# Altium footprint library IC.PcbLib: 220 footprints (part 12 of 14)
Each footprint in its own frame and in the unit in brackets; x right, y up, seen from the top. Pads: shape width x height; smd on the part's side, far side on the other; paste and mask are expansions set on the pad; w line width, h text height; cw(c..) or ccw(c..) is an arc to the next point about the centre after c.
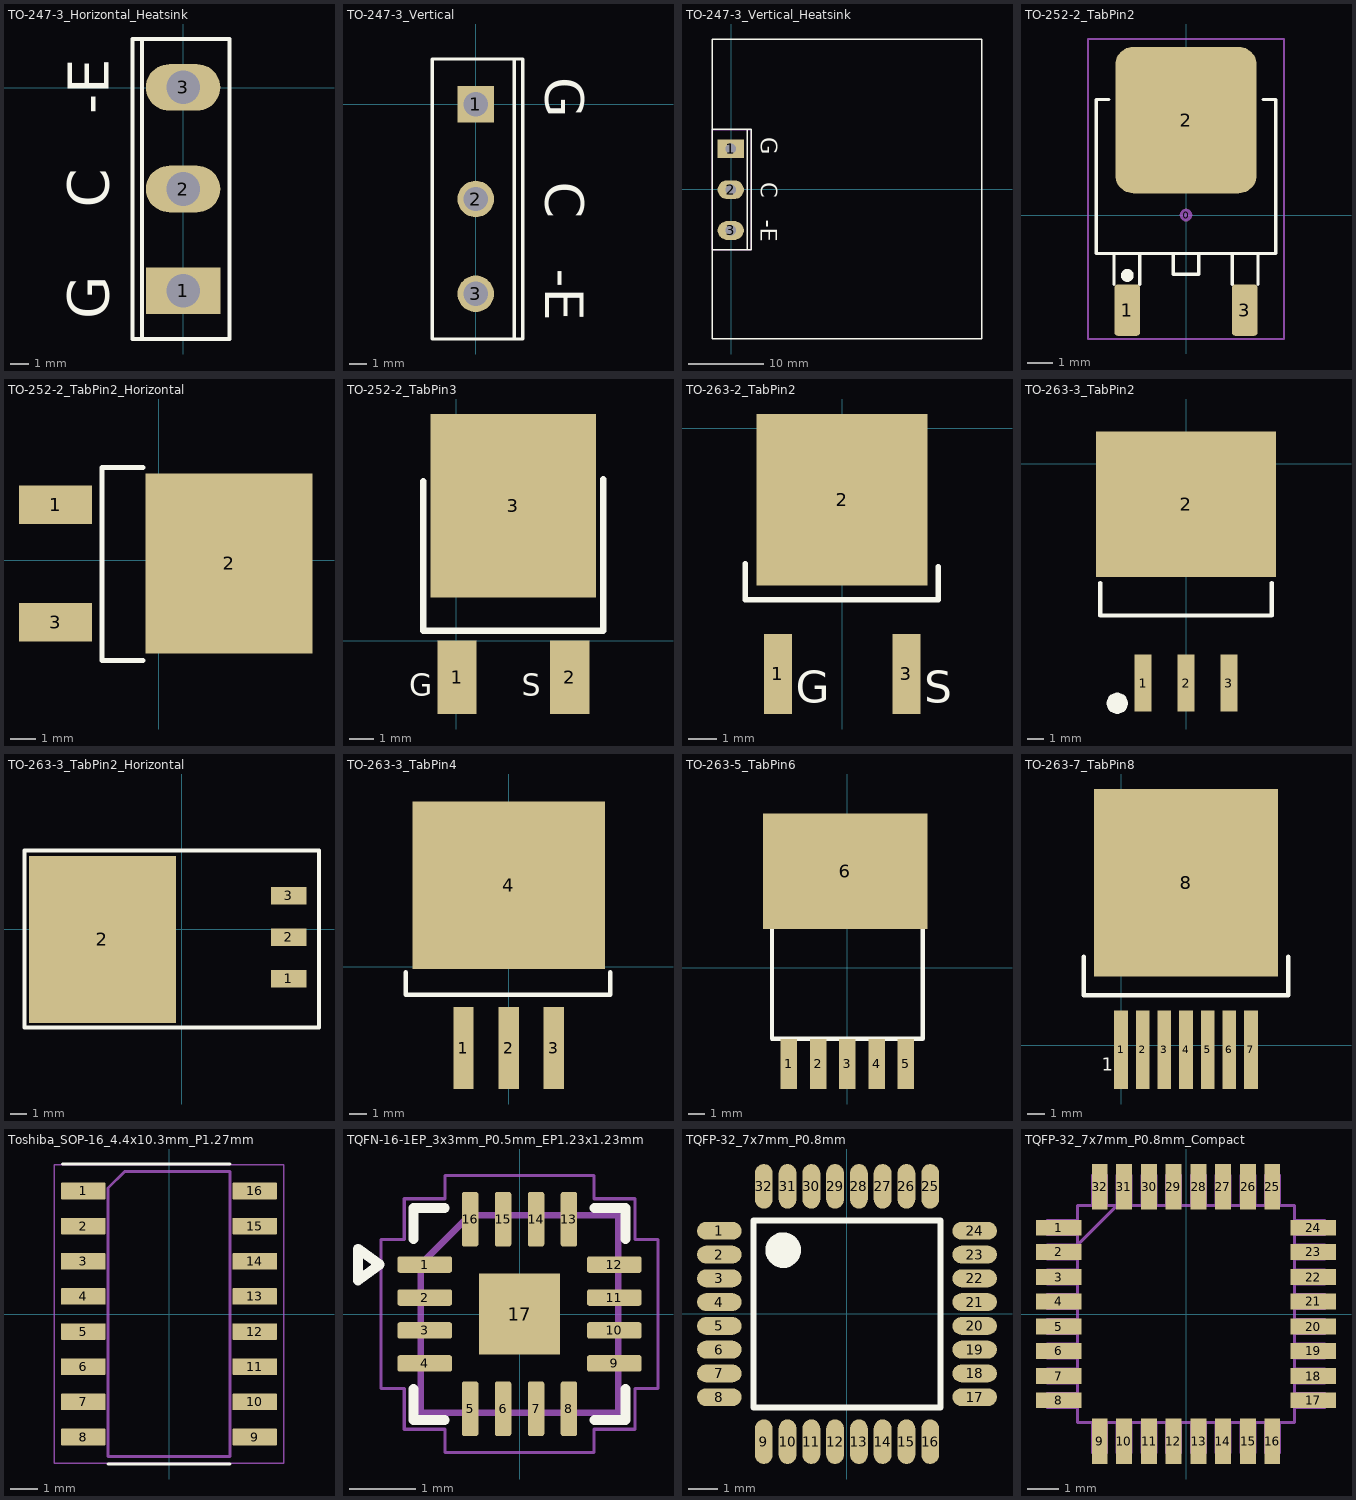
[diagram p11: the footprints below, top view; thin cyan lines are the x and y axes]

## TO-247-3_Horizontal_Heatsink [mm] "TO-247 3-pin bent/horizontal with heatsink, pitch 5.45mm"
height 30
pads (3):
  rect 4x2.5 hole 1.8: 1(0,-10.871)
  oval 4x2.5 hole 1.8: 2(0,-5.421) 3(0,0.029)
Top Overlay:
  lines w0.2: -2.21,-13.471 -2.21,2.629 ; -2.71,-13.471 -2.71,2.629 2.49,2.629 2.49,-13.471 -2.71,-13.471
  text "G" at -4,-12.421 h2.2
  text "C" at -4,-6.421 h2.2
  text "-E" at -4,-1.421 h2.2
3D body "IGBT and Heatsink.STEP": height 18.01, standoff -3.99, extent -7.173,-25.461 32.827,14.539

## TO-247-3_Vertical [mm] "TO-247 3-pin vertical without heatsink, pitch 5.45mm"
pads (3):
  rect 2.1x2.1 hole 1.4: 1(0,0)
  round 2.1 hole 1.4: 2(0,-5.45) 3(0,-10.9)
Top Overlay:
  lines w0.2: 2.21,-13.5 2.21,2.6 ; -2.49,-13.5 2.71,-13.5 2.71,2.6 -2.49,2.6 -2.49,-13.5
  text "-E" at 4,-9.45 h2.2
  text "C" at 4,-4.45 h2.2
  text "G" at 4,1.55 h2.2
3D body "TO-247-3_Vertical.step": height 23.5, standoff -3, extent -7.95,-11.404 7.95,0.504

## TO-247-3_Vertical_Heatsink [mm] "TO-247 3-pin vertical with heatsink, pitch 5.45mm"
pads (3):
  rect 3.5x2.5 hole 1.4: 1(-0.076,5.425)
  oval 3.5x2.5 hole 1.4: 2(-0.076,-0.025) 3(-0.076,-5.475)
Top Overlay:
  lines w0.178: 2.134,-8.075 2.134,8.025 ; 33.426,20.091 -2.566,20.091 -2.566,8.025 ; 33.452,20.091 33.452,-19.964 -2.565,-19.964 -2.565,-8.076 -2.566,-8.075 ; -2.566,-8.075 -2.566,8.025 ; -2.566,-8.075 2.634,-8.075 2.634,8.025 -2.566,8.025
  text "G" at 3.924,6.975 h2.2
  text "C" at 3.924,0.975 h2.2
  text "-E" at 3.924,-4.025 h2.2
Mechanical 13:
  lines w0.1: 2.634,-8.05 2.634,8 ; 2.634,-8.05 -2.566,-8.05 -2.566,8 2.634,8 ; 2.634,-8.05 2.634,8
3D body "tony_assembly_14_asm.stp": height 52, standoff -2.2, extent -2.591,-19.949 33.57,20.051

## TO-252-2_TabPin2 [mm] "TO-252 (DPAK), 2 leads + tab pin 2 (with thermal pad 0)"
pads (4):
  round 0.5 on Mech15: 0(0,0)
  rrect25% 1x2 smd: 1(-2.285,-3.7) 3(2.285,-3.7)
  rrect25% 5.5x5.7 smd: 2(0,3.7)
Top Overlay:
  circle w0.25: c-2.285,-2.35 r0.125
  lines w0.127: -3,4.5 -3.5,4.5 -3.5,-1.5 3.5,-1.5 3.5,4.5 3,4.5 ; -2.8,-2.7 -2.8,-1.5 -1.8,-1.5 -1.8,-2.7 ; 1.8,-2.7 1.8,-1.5 2.8,-1.5 2.8,-2.7 ; -0.5,-2.3 0.5,-2.3 0.5,-1.5 -0.5,-1.5 -0.5,-2.3
Mechanical 15:
  lines w0.076: -3.81,-4.826 3.81,-4.826 3.81,6.858 -3.81,6.858 -3.81,-4.826
3D body "DPAK.stp": height 2.31, standoff 0, extent -3.3,-3.951 3.3,5.762

## TO-252-2_TabPin2_Horizontal [mm] "TO-252 (DPAK) rotated 90deg, 2 leads left + tab pin 2 right"
height 2.39
pads (3):
  rect 2.85x1.5 smd: 1(-4.023,2.163) 3(-4.023,-2.417)
  rect 6.5x7 smd: 2(2.727,-0.127)
Top Overlay:
  lines w0.2: -0.623,-3.9 -2.223,-3.9 -2.223,3.6 -0.623,3.6
3D body "User Library-TO252AA.step": height 2.3, standoff -0.01, extent -4.469,-3.429 5.231,3.151

## TO-252-2_TabPin3 [mm] "TO-252 (DPAK), leads 1-2 bottom + tab pin 3 top"
height 2.4
pads (3):
  rect 1.6x3 smd: 1(0.037,-1.484) 2(4.637,-1.484)
  rect 6.75x7.5 smd: 3(2.337,5.512)
Top Overlay:
  lines w0.254: -1.346,6.516 -1.346,0.416 6,0.416 6,6.6
  text "S" at 2.667,-2.54 h1.52
  text "G" at -1.905,-2.54 h1.52
3D body "CircuitWorks-TO-252.step": height 2.31, standoff 0.01, extent -0.877,-1.282 5.703,8.418

## TO-263-2_TabPin2 [mm] "TO-263-2 (D2PAK), 2 leads bottom + tab pin 2 top, pitch 4.58mm"
height 4.6
pads (3):
  rect 1x2.85 smd: 1(-2.29,-8.75) 3(2.29,-8.75)
  rect 6.096x6.1 smd: 2(0,-2.54)
Top Overlay:
  lines w0.2: -3.454,-4.826 -3.454,-6.1 3.429,-6.1 3.429,-4.928
  text "G" at -1.651,-9.779 h1.14
  text "S" at 2.921,-9.779 h1.14
3D body "User Library-TO252AA.step": height 2.3, standoff -0.01, extent -3.302,-9.295 3.278,0.405

## TO-263-3_TabPin2 [mm] "TO-263-3 (D2PAK), 3 leads bottom + tab pin 2 top, pitch 2.54mm"
pads (5):
  rect 1x3.4 smd: 1(-2.54,-13) 2(0,-13) 3(2.54,-13)
  rect 10.7x8.6 smd: 2(0,-2.4)
  round 1.27 on Top Overlay: ""(-4.075,-14.2)
Top Overlay:
  lines w0.254: -5.08,-7.067 -5.08,-9 5.08,-9 5.08,-7.067
3D body "User Library-TO263-3-1.STEP": height 4.6, standoff -0.03, extent -5.193,-13.894 5.207,1.956

## TO-263-3_TabPin2_Horizontal [mm] "TO-263-3 (D2PAK) rotated 90deg, 3 leads right + tab pin 2 left (LM1085)"
height 1.27
pads (4):
  rect 2.16x1.07 smd: 1(6.545,-3.039) 2(6.545,-0.499) 3(6.545,2.041)
  rect 9x10.2 smd: 2(-4.836,-0.62)
Top Overlay:
  lines w0.254: -9.6,-6 -9.6,4.8 8.4,4.8 8.4,-6 -9.6,-6
3D body "DDPAK-TO-263-3.step": height 4.44, standoff 0, extent -8.98,-5.555 7.67,4.605

## TO-263-3_TabPin4 [mm] "TO-263-3 (D2PAK), 3 leads bottom + tab pin 4 top, pitch 2.54mm"
height 4.57
pads (4):
  rect 1.15x4.6 smd: 1(-2.54,-4.575) 2(0,-4.575) 3(2.54,-4.575)
  rect 10.8x9.4 smd: 4(0,4.575)
Top Overlay:
  lines w0.254: -5.79,-0.325 -5.79,-1.575 5.71,-1.575 5.71,-0.325
3D body "69246.stp": height 4.51, standoff 0.01, extent -5.05,-6.469 5.05,8.921

## TO-263-5_TabPin6 [mil] "TO-263-5 (D2PAK-5), 5 leads + tab, pitch 1.78mm"
pads (6):
  rect 39.37x120 smd: 1(-140,-230) 2(-70,-230) 3(0,-230) 4(70,-230) 5(140,-230)
  rect 393.7x275.59 smd: 6(-5,230)
Top Overlay:
  lines w10: -160,170 -160,240 -140,260 140,260 160,240 160,170 ; -180,-170 180,-170 180,170 -180,170 -180,-170
3D body "TO-263-5.STEP": height 180.12, standoff 0.6, extent -200,-241.79 200,309.98

## TO-263-7_TabPin8 [mm] "TO-263-7 (D2PAK-7), 7 leads + tab, pitch 1.27mm"
height 4.7
pads (8):
  rect 0.8x4.6 smd: 1(0,-0.254) 2(1.27,-0.254) 3(2.54,-0.254) 4(3.81,-0.254) 5(5.08,-0.254) 6(6.35,-0.254) 7(7.62,-0.254)
  rect 10.8x11 smd: 8(3.81,9.531)
Top Overlay:
  lines w0.254: -2.19,5.2 -2.19,2.95 9.81,2.95 9.81,5.2
  text "1" at -1.143,-1.491 h0.76
3D body "User Library-TO263-7-1.STEP": height 4.81, standoff 0.01, extent -1.241,-1.781 8.759,13.889

## Toshiba_SOP-16_4.4x10.3mm_P1.27mm [mm] "TLP281-4, Four-channel phototransistor optocoupler — Opto cách ly quang bốn kênh ngõ ra transistor [Opto cach ly quang bon kenh ngo ra transistor]"
height 2.1
pads (16):
  rrect8% 1.6x0.6 smd: 1(-3.1,4.445) 2(-3.1,3.175) 3(-3.1,1.905) 4(-3.1,0.635) 5(-3.1,-0.635) 6(-3.1,-1.905) 7(-3.1,-3.175) 8(-3.1,-4.445) 9(3.1,-4.445) 10(3.1,-3.175) 11(3.1,-1.905) 12(3.1,-0.635) 13(3.1,0.635) 14(3.1,1.905) 15(3.1,3.175) 16(3.1,4.445)
Top Overlay:
  lines w0.12: -3.85,5.42 2.2,5.42 ; -2.2,-5.42 2.2,-5.42
  text ".Designator" at -2.2,5.6 h1
Mechanical 2:
  lines w0.1: -2.2,-5.15 2.2,-5.15 2.2,5.15 -1.6,5.15 -2.2,4.55 -2.2,-5.15
Mechanical 4:
  lines w0.05: -4.15,-5.4 4.15,-5.4 4.15,5.4 -4.15,5.4 -4.15,-5.4
3D body "Toshiba_SOP-16_4.4x10.3mm_P1.27mm.step": height 0, standoff 0, extent -3.9,-4.745 3.9,4.745

## TQFN-16-1EP_3x3mm_P0.5mm_EP1.23x1.23mm [mm] "MAX98357AETE+T, 3.2 W class-D mono I2S speaker amplifier — IC khuếch đại loa I2S mono Class D 3,2 W [IC khuech dai loa I2S mono Class D 3,2 W]"
height 0.75
pads (17):
  rrect25% 0.825x0.25 smd: 1(-1.438,0.75) 2(-1.438,0.25) 3(-1.438,-0.25) 4(-1.438,-0.75) 9(1.438,-0.75) 10(1.438,-0.25) 11(1.438,0.25) 12(1.438,0.75)
  rrect25% 0.25x0.825 smd: 5(-0.75,-1.438) 6(-0.25,-1.438) 7(0.25,-1.438) 8(0.75,-1.438) 13(0.75,1.438) 14(0.25,1.438) 15(-0.25,1.438) 16(-0.75,1.438)
  rect 1.23x1.23 smd paste-1.23: 17(0,0)
Top Overlay:
  lines w0.15: -1.61,-1.135 -1.61,-1.61 -1.135,-1.61 ; -1.61,1.135 -1.61,1.61 -1.135,1.61 ; 1.135,-1.61 1.61,-1.61 1.61,-1.135 ; 1.135,1.61 1.61,1.61 1.61,1.135 ; -2.45,0.51 -2.12,0.75 -2.45,0.99 -2.45,0.51
Top Paste:
  region: -0.56,0.06 -0.06,0.06 -0.06,0.56 -0.56,0.56
  region: -0.56,-0.56 -0.06,-0.56 -0.06,-0.06 -0.56,-0.06
  region: 0.06,0.06 0.56,0.06 0.56,0.56 0.06,0.56
  region: 0.06,-0.56 0.56,-0.56 0.56,-0.06 0.06,-0.06
Mechanical 2:
  lines w0.1: -1.5,-1.5 1.5,-1.5 1.5,1.5 -0.75,1.5 -1.5,0.75 -1.5,-1.5
Mechanical 4:
  lines w0.05: -2.1,-1.13 -2.1,1.13 -1.75,1.13 -1.75,1.75 -1.13,1.75 -1.13,2.1 1.13,2.1 1.13,1.75 1.75,1.75 1.75,1.13 2.1,1.13 2.1,-1.13 1.75,-1.13 1.75,-1.75 1.13,-1.75 1.13,-2.1 -1.13,-2.1 -1.13,-1.75 -1.75,-1.75 -1.75,-1.13 -2.1,-1.13
3D body "TQFN-16-1EP_3x3mm_P0.5mm_EP1.23x1.23mm.step": height 0, standoff 0, extent -1.85,-1.85 1.85,1.85

## TQFP-32_7x7mm_P0.8mm [mm] "TQFP-32, body 7x7mm, pitch 0.8mm, span 8.6mm"
height 1.2
pads (32):
  oval 1.5x0.6 smd mask+0.076: 1(-4.3,2.8) 2(-4.3,2) 3(-4.3,1.2) 4(-4.3,0.4) 5(-4.3,-0.4) 6(-4.3,-1.2) 7(-4.3,-2) 8(-4.3,-2.8) 17(4.3,-2.8) 18(4.3,-2) 19(4.3,-1.2) 20(4.3,-0.4) 21(4.3,0.4) 22(4.3,1.2) 23(4.3,2) 24(4.3,2.8)
  oval 0.6x1.5 smd mask+0.076: 9(-2.8,-4.3) 10(-2,-4.3) 11(-1.2,-4.3) 12(-0.4,-4.3) 13(0.4,-4.3) 14(1.2,-4.3) 15(2,-4.3) 16(2.8,-4.3) 25(2.8,4.3) 26(2,4.3) 27(1.2,4.3) 28(0.4,4.3) 29(-0.4,4.3) 30(-1.2,4.3) 31(-2,4.3) 32(-2.8,4.3)
Top Overlay:
  circle w0.6: c-2.15,2.15 r0.3
  lines w0.2: -3.15,-3.15 3.15,-3.15 3.15,3.15 -3.15,3.15 -3.15,-3.15
3D body "TQFP80P925X925X120-32N.step": height 1.2, standoff 0, extent -4.625,-4.625 4.625,4.625

## TQFP-32_7x7mm_P0.8mm_Compact [mil] "TQFP-32, body 7x7mm, pitch 0.8mm, span 8.23mm (ATmega168/328)"
pads (32):
  rect 58x20 smd: 1(-162,110) 2(-162,79) 3(-162,47) 4(-162,16) 5(-162,-16) 6(-162,-47) 7(-162,-79) 8(-162,-110) 17(162,-110) 18(162,-79) 19(162,-47) 20(162,-16) 21(162,16) 22(162,47) 23(162,79) 24(162,110)
  rect 20x58 smd: 9(-110,-162) 10(-79,-162) 11(-47,-162) 12(-16,-162) 13(16,-162) 14(47,-162) 15(79,-162) 16(110,-162) 25(110,162) 26(79,162) 27(47,162) 28(16,162) 29(-16,162) 30(-47,162) 31(-79,162) 32(-110,162)
Mechanical 13:
  drawing of 169 lines, arcs and shapes, not listed
3D body "ATMEGA168-20AU.STEP": height 46.67, standoff -0.57, extent -177.16,-177.16 177.17,177.16